# Altium footprint library LED.PcbLib: 49 footprints (part 4 of 4)
Each footprint in its own frame and in the unit in brackets; x right, y up, seen from the top. Pads: shape width x height; smd on the part's side, far side on the other; paste and mask are expansions set on the pad; w line width, h text height; cw(c..) or ccw(c..) is an arc to the next point about the centre after c.
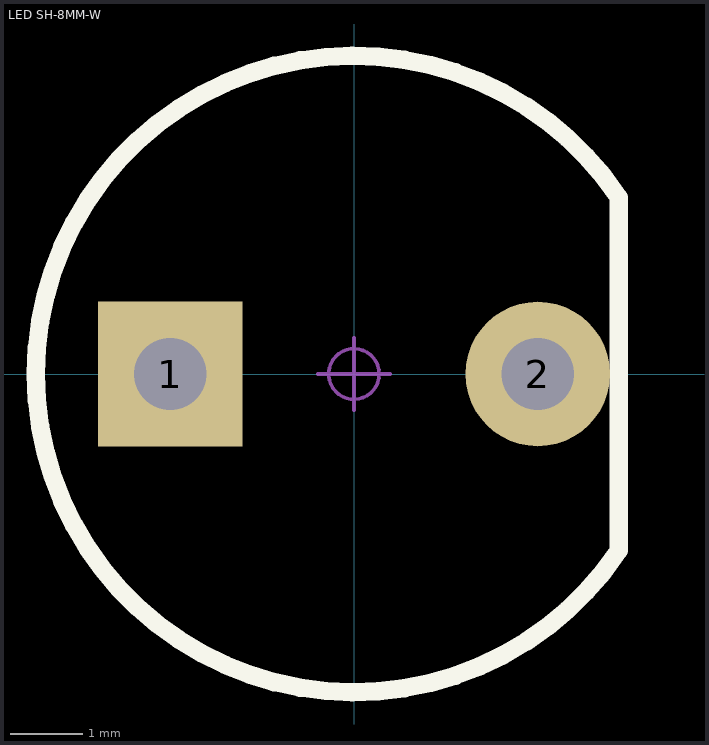
[diagram p3: the footprint, top view; thin cyan lines are the x and y axes]

## LED SH-8MM-W [mm] "白色8mm草帽，直插LED"
height 10.16
pads (2):
  rect 2x2 hole 1: 1(-2.54,0)
  round 2 hole 1: 2(2.54,0)
Top Overlay:
  lines w0.254: 3.661,-2.441 cw(c0,0) 3.661,2.441 3.661,-2.441
Mechanical 15:
  circle w0.05: c0,0 r0.35
  lines w0.05: -0.5,0 0.5,0 ; 0,-0.5 0,0.5
3D body "8MM草帽灯_灯罩.STEP": height 10.5, standoff 4.1, extent -4.4,-4.399 4,4.399
3D body "8MM草帽灯.STEP": height 8.6, standoff -3.6, extent -3.54,-1.326 3.54,1.327